# Altium footprint library Dart_Controller_Pcblib.PcbLib: 132 footprints (part 5 of 9)
Each footprint in its own frame and in the unit in brackets; x right, y up, seen from the top. Pads: shape width x height; smd on the part's side, far side on the other; paste and mask are expansions set on the pad; w line width, h text height; cw(c..) or ccw(c..) is an arc to the next point about the centre after c.
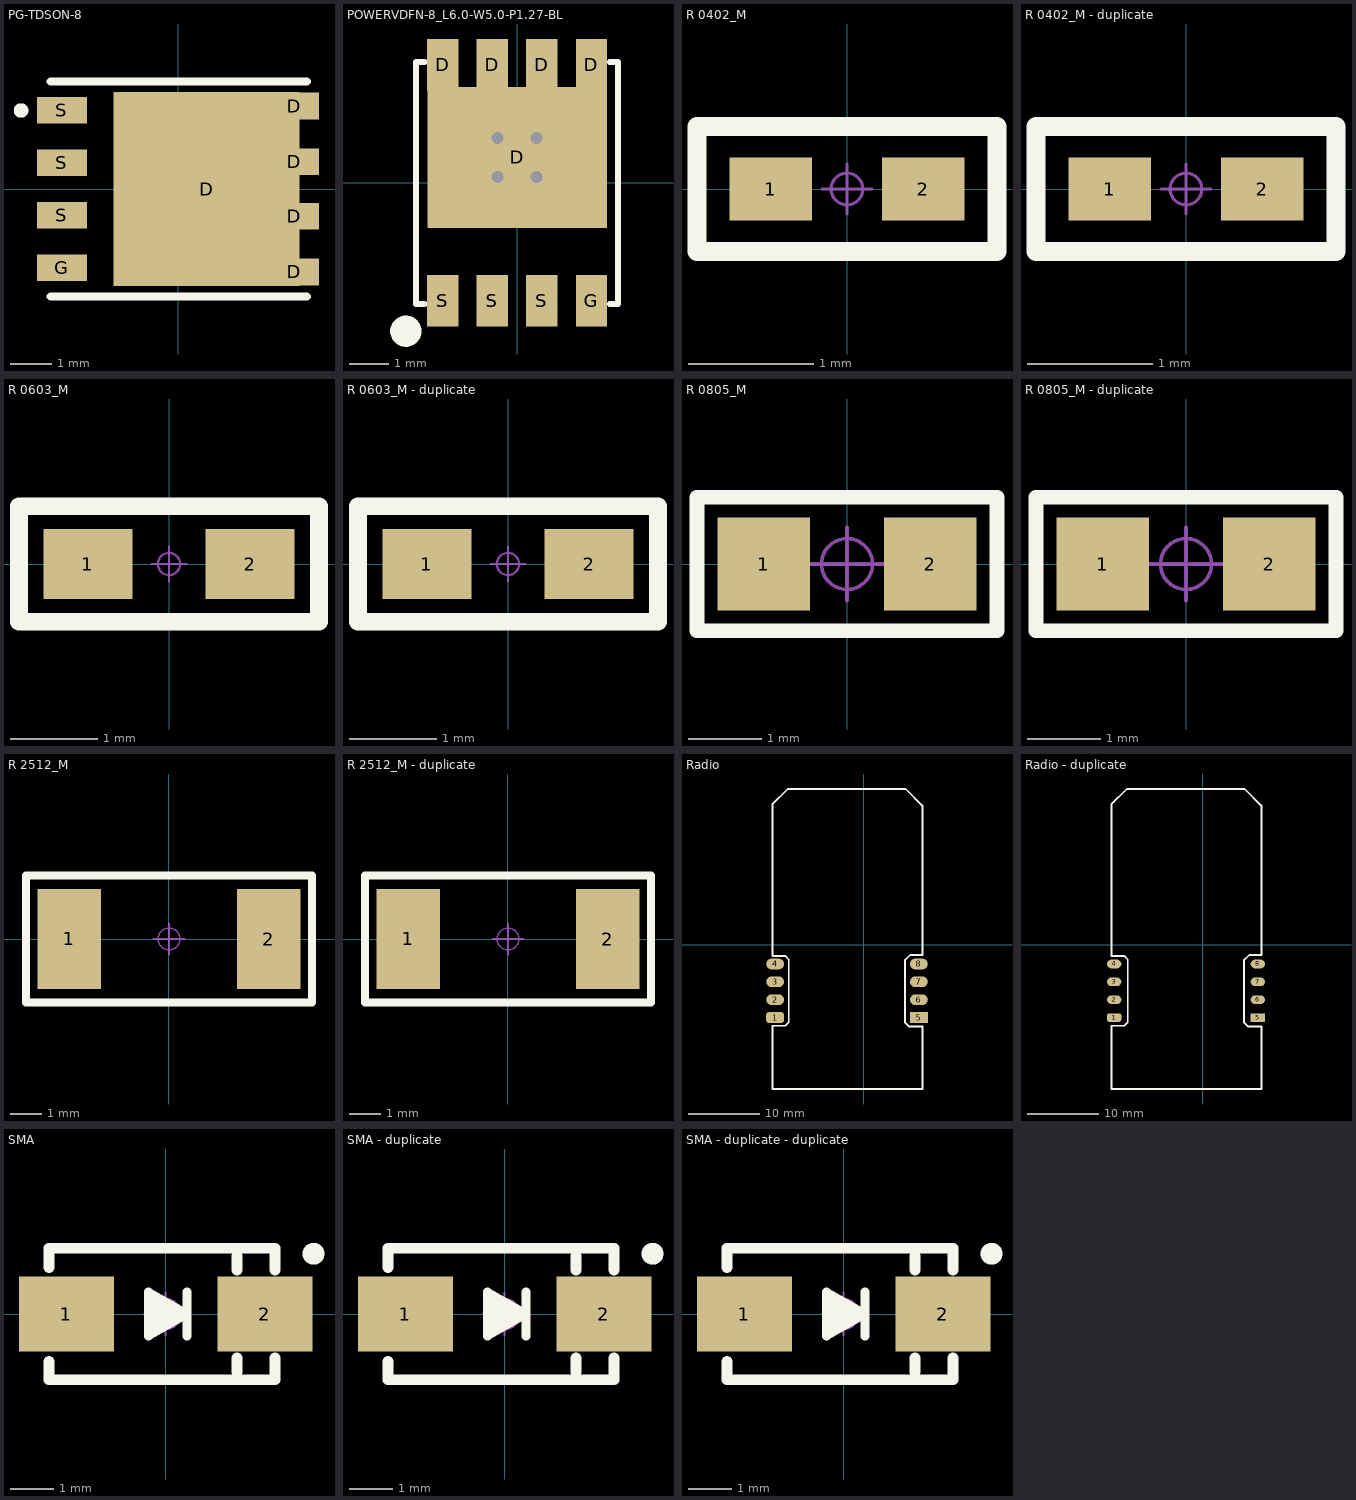
[diagram p4: the footprints below, top view; thin cyan lines are the x and y axes]

## PCBComponent_1 [mm]

## PG-TDSON-8 [mm]
height 0.9
pads (9):
  rect 4.5x4.7 smd: D(0.691,0)
  rect 1.2x0.65 smd: D(2.81,-2.007) D(2.81,-0.66) D(2.81,0.66) D(2.81,2.007) G(-2.809,-1.905) S(-2.809,-0.635) S(-2.809,0.635) S(-2.809,1.905)
Top Overlay:
  circle w0.25: c-3.8,1.9 r0.05
  lines w0.2: -3.084,-2.6 3.116,-2.6 ; -3.084,2.6 3.116,2.6
3D body "TDSON-8-1.stp": height 1.01, standoff 0, extent -3.059,-2.695 3.091,2.695

## POWERVDFN-8_L6.0-W5.0-P1.27-BL [mm]
pads (9):
  rect 0.8x1.321 smd paste-100 mask+0.051: D(-1.905,3.025) D(-0.635,3.025) D(0.635,3.025) D(1.905,3.025) G(1.905,-3.025) S(-1.905,-3.025) S(-0.635,-3.025) S(0.635,-3.025)
  rect 4.6x3.6 smd paste-100 mask+0.051: D(0,0.65)
via -0.5,1.15 diameter 0.61 hole 0.305
via 0.5,1.15 diameter 0.61 hole 0.305
via -0.5,0.15 diameter 0.61 hole 0.305
via 0.5,0.15 diameter 0.61 hole 0.305
Top Overlay:
  circle w0.4: c-2.85,-3.8 r0.2
  lines w0.152: -2.376,-3.101 -2.586,-3.101 -2.586,3.101 -2.376,3.101 ; 2.376,-3.101 2.586,-3.101 2.586,3.101 2.376,3.101
Top Paste:
  region: 2.305,2.365 2.305,3.686 1.505,3.686 1.505,2.45 1.035,2.45 1.035,3.686 0.235,3.686 0.235,2.45 -0.235,2.45 -0.235,3.686 -1.035,3.686 -1.035,2.45 -1.505,2.45 -1.505,3.686 -2.305,3.686 -2.305,2.365 -2.3,2.365 -2.3,-1.15 2.3,-1.15 2.3,2.365
  region: 1.505,-2.365 1.505,-3.686 2.305,-3.686 2.305,-2.365
  region: 1.035,-3.686 1.035,-2.365 0.235,-2.365 0.235,-3.686
  region: -0.235,-3.686 -0.235,-2.365 -1.035,-2.365 -1.035,-3.686
  region: -1.505,-3.686 -1.505,-2.365 -2.305,-2.365 -2.305,-3.686
Mechanical 15:
  circle w0.2: c-1.905,-3.325 r0.1
3D body "PMOS_CORR.step": height 1.01, standoff 0, extent -2.64,-3.05 2.64,3.05

## R 0402_M [mil] "1/16W贴片电阻       淘宝ID:黄晶宝石"
pads (2):
  rect 26x20 smd: 1(-24,0) 2(24,0)
Top Overlay:
  lines w6: -47.24,-19.68 47.24,-19.68 47.24,19.68 -47.24,19.68 -47.24,-19.68
Mechanical 15:
  circle w1: c0,0 r5
  lines w1: -7.87,0 7.87,0 ; 0,-7.87 0,7.87
3D body "R 0402.STEP": height 11.85, standoff -0.09, extent -19.68,-9.84 19.69,9.85

## R 0402_M - duplicate [mil] "1/16W贴片电阻       淘宝ID:黄晶宝石"
pads (2):
  rect 26x20 smd: 1(-24,0) 2(24,0)
Top Overlay:
  lines w6: -47.24,-19.68 -47.24,19.68 47.24,19.68 47.24,-19.68 -47.24,-19.68
Mechanical 15:
  circle w1: c0,0 r5
  lines w1: -7.87,0 7.87,0 ; 0,-7.87 0,7.87
3D body "R 0402.STEP": height 11.85, standoff -0.09, extent -19.68,-9.84 19.69,9.85

## R 0603_M [mil] "1/10W贴片电阻                             淘宝ID:黄晶宝石"
pads (2):
  rect 40x31.5 smd: 1(-36.5,0) 2(36.5,0)
Top Overlay:
  lines w8: -67.5,-26 67.5,-26 67.5,26 -67.5,26 -67.5,-26
Mechanical 15:
  circle w1: c0,0 r5
  lines w1: -7.87,0 7.87,0 ; 0,-7.87 0,7.87
3D body "R 0603.STEP": height 15.79, standoff -0.13, extent -31.49,-15.74 31.5,15.75

## R 0603_M - duplicate [mil] "1/10W贴片电阻                             淘宝ID:黄晶宝石"
pads (2):
  rect 40x31.5 smd: 1(-36.5,0) 2(36.5,0)
Top Overlay:
  lines w8: -67.5,-26 67.5,-26 67.5,26 -67.5,26 -67.5,-26
Mechanical 15:
  circle w1: c0,0 r5
  lines w1: -7.87,0 7.87,0 ; 0,-7.87 0,7.87
3D body "R 0603.STEP": height 15.79, standoff -0.13, extent -31.49,-15.74 31.5,15.75

## R 0805_M [mil] "1/8W贴片电阻"
pads (2):
  rect 50x50 smd: 1(-45,0) 2(45,0)
Top Overlay:
  lines w8: -81,-36 -81,36 81,36 81,-36 -81,-36
Mechanical 15:
  circle w1.97: c0,0 r13.78
  lines w1.97: -19.68,0 19.68,0 ; 0,-19.68 0,19.68
3D body "R 0805.STEP": height 19.72, standoff -0.24, extent -39.37,-24.6 39.37,24.61

## R 0805_M - duplicate [mil] "1/8W贴片电阻"
pads (2):
  rect 50x50 smd: 1(-45,0) 2(45,0)
Top Overlay:
  lines w8: -81,-36 81,-36 81,36 -81,36 -81,-36
Mechanical 15:
  circle w1.97: c0,0 r13.78
  lines w1.97: -19.68,0 19.68,0 ; 0,-19.68 0,19.68
3D body "R 0805.STEP": height 19.72, standoff -0.24, extent -39.37,-24.6 39.37,24.61

## R 2512_M [mm] "1W贴片电阻  淘宝ID:黄晶宝石"
pads (2):
  rect 2.032x3.2 smd: 1(-3.2,0) 2(3.2,0)
Top Overlay:
  lines w0.254: -4.572,-2.032 -4.572,2.032 4.572,2.032 4.572,-2.032 -4.572,-2.032
Mechanical 15:
  circle w0.05: c0,0 r0.35
  lines w0.05: -0.5,0 0.5,0 ; 0,-0.5 0,0.5
3D body "R 2512.STEP": height 0.55, standoff -0.02, extent -3.2,-1.6 3.2,1.6

## R 2512_M - duplicate [mm] "1W贴片电阻  淘宝ID:黄晶宝石"
pads (2):
  rect 2.032x3.2 smd: 1(-3.2,0) 2(3.2,0)
Top Overlay:
  lines w0.254: -4.572,-2.032 -4.572,2.032 4.572,2.032 4.572,-2.032 -4.572,-2.032
Mechanical 15:
  circle w0.05: c0,0 r0.35
  lines w0.05: -0.5,0 0.5,0 ; 0,-0.5 0,0.5
3D body "R 2512.STEP": height 0.55, standoff -0.02, extent -3.2,-1.6 3.2,1.6

## Radio [mm] "无线电-匿名数传"
pads (8):
  rrect50% 2.5x1.5 smd: 1(-12.372,-10.16)
  oval 2.5x1.5 smd: 2(-12.372,-7.66) 3(-12.372,-5.16) 4(-12.372,-2.66) 6(7.747,-7.66) 7(7.747,-5.16) 8(7.747,-2.66)
  rect 2.5x1.5 smd: 5(7.747,-10.16)
Top Overlay:
  lines w0.254: -12.753,-20.16 8.247,-20.16 8.247,-16.51 8.247,-11.43 6.424,-11.43 5.789,-10.795 5.789,-2.159 6.551,-1.397 8.247,-1.397 8.247,15.875 8.247,19.513 5.92,21.84 -10.598,21.84 -12.753,19.685 -12.753,15.875 -12.753,-1.524 -10.975,-1.524 -10.467,-2.032 -10.467,-10.795 -10.975,-11.303 -12.753,-11.303 -12.753,-16.51 -12.753,-20.16

## Radio - duplicate [mm] "无线电-匿名数传"
pads (8):
  rrect50% 2x1.2 smd: 1(-12.372,-10.16)
  oval 2x1.2 smd: 2(-12.372,-7.66) 3(-12.372,-5.16) 4(-12.372,-2.66) 6(7.747,-7.66) 7(7.747,-5.16) 8(7.747,-2.66)
  rect 2x1.2 smd: 5(7.747,-10.16)
Top Overlay:
  lines w0.254: -12.753,-20.16 -12.753,-16.51 -12.753,-11.303 -10.975,-11.303 -10.467,-10.795 -10.467,-2.032 -10.975,-1.524 -12.753,-1.524 -12.753,15.875 -12.753,19.685 -10.598,21.84 5.92,21.84 8.247,19.513 8.247,15.875 8.247,-1.397 6.551,-1.397 5.789,-2.159 5.789,-10.795 6.424,-11.43 8.247,-11.43 8.247,-16.51 8.247,-20.16 -12.753,-20.16

## SMA [mm] "4.5x2.6*2.2mm（长宽高，不包括引脚）"
height 2.54
pads (2):
  rect 2.2x1.75 smd: 1(-2.3,0) 2(2.3,0)
Top Overlay:
  circle w0.254: c3.429,1.397 r0.127
  lines w0.203: 0.494,-0.508 0.494,0.508 ; -0.395,-0.508 0.494,0 -0.395,0.508 -0.395,-0.508
  lines w0.254: -2.7,-1.105 -2.7,-1.524 2.54,-1.524 2.54,-1.016 ; -2.7,1.08 -2.7,1.524 2.54,1.524 2.54,1.016 ; -0.33,0.305 0.305,0 -0.254,-0.305 -0.254,0.051 0.023,0 ; 1.651,-1.35 1.651,-1.016 ; 1.651,1.016 1.651,1.35
Mechanical 15:
  circle w0.05: c0,0 r0.35
  lines w0.05: -0.5,0 0.5,0 ; 0,-0.5 0,0.5
3D body "SMA.STEP": height 2.15, standoff 0.04, extent -2.528,-1.3 2.575,1.3

## SMA - duplicate [mm] "4.5x2.6*2.2mm（长宽高，不包括引脚）"
height 2.54
pads (2):
  rect 2.2x1.75 smd: 1(-2.3,0) 2(2.3,0)
Top Overlay:
  circle w0.254: c3.429,1.397 r0.127
  lines w0.203: 0.494,-0.508 0.494,0.508 ; -0.395,-0.508 -0.395,0.508 0.494,0 -0.395,-0.508
  lines w0.254: -2.7,-1.105 -2.7,-1.524 2.54,-1.524 2.54,-1.016 ; -2.7,1.08 -2.7,1.524 2.54,1.524 2.54,1.016 ; -0.33,0.305 0.305,0 -0.254,-0.305 -0.254,0.051 0.023,0 ; 1.651,-1.35 1.651,-1.016 ; 1.651,1.016 1.651,1.35
Mechanical 15:
  circle w0.05: c0,0 r0.35
  lines w0.05: -0.5,0 0.5,0 ; 0,-0.5 0,0.5
3D body "SMA.STEP": height 2.15, standoff 0.04, extent -2.528,-1.3 2.575,1.3

## SMA - duplicate - duplicate [mm] "4.5x2.6*2.2mm（长宽高，不包括引脚）"
height 2.54
pads (2):
  rect 2.2x1.75 smd: 1(-2.3,0) 2(2.3,0)
Top Overlay:
  circle w0.254: c3.429,1.397 r0.127
  lines w0.203: 0.494,-0.508 0.494,0.508 ; -0.395,-0.508 0.494,0 -0.395,0.508 -0.395,-0.508
  lines w0.254: -2.7,-1.105 -2.7,-1.524 2.54,-1.524 2.54,-1.016 ; -2.7,1.08 -2.7,1.524 2.54,1.524 2.54,1.016 ; -0.33,0.305 0.305,0 -0.254,-0.305 -0.254,0.051 0.023,0 ; 1.651,-1.35 1.651,-1.016 ; 1.651,1.016 1.651,1.35
Mechanical 15:
  circle w0.05: c0,0 r0.35
  lines w0.05: -0.5,0 0.5,0 ; 0,-0.5 0,0.5
3D body "SMA.STEP": height 2.15, standoff 0.04, extent -2.528,-1.3 2.575,1.3